# Altium footprint library pi4.PcbLib: 46 footprints (part 1 of 3)
Each footprint in its own frame and in the unit in brackets; x right, y up, seen from the top. Pads: shape width x height; smd on the part's side, far side on the other; paste and mask are expansions set on the pad; w line width, h text height; cw(c..) or ccw(c..) is an arc to the next point about the centre after c.
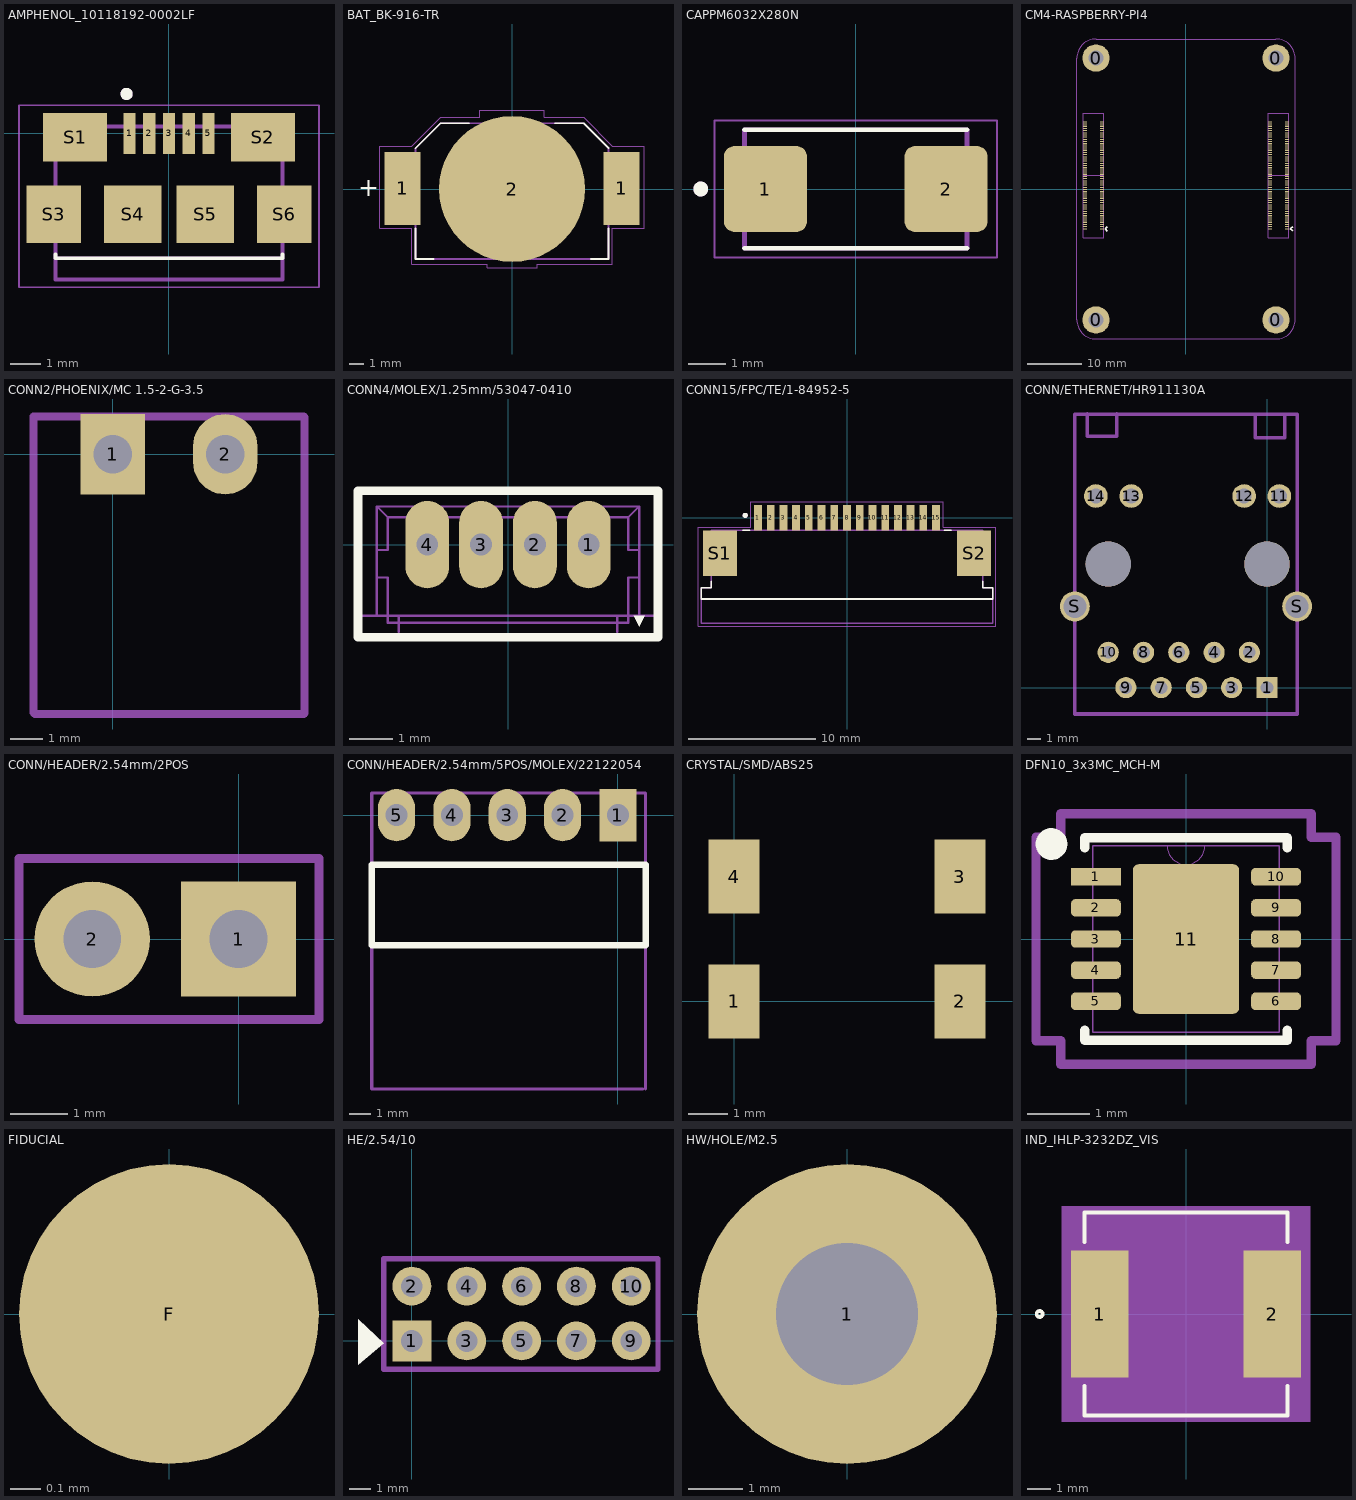
[diagram p0: the footprints below, top view; thin cyan lines are the x and y axes]

## AMPHENOL_10118192-0002LF [mm]
pads (11):
  rect 0.4x1.35 smd: 1(-1.3,0) 2(-0.65,0) 3(0,0) 4(0.65,0) 5(1.3,0)
  rect 2.1x1.6 smd: S1(-3.1,-0.125) S2(3.1,-0.125)
  rect 1.8x1.9 smd: S3(-3.8,-2.675) S6(3.8,-2.675)
  rect 1.9x1.9 smd: S4(-1.2,-2.675) S5(1.2,-2.675)
Top Overlay:
  circle w0.2: c-1.4,1.3 r0.1
  lines w0.127: -3.75,-4 -3.75,-4.125 3.75,-4.125 3.75,-4
Mechanical 13:
  circle w0.2: c-1.4,1.3 r0.1
  lines w0.127: -3.75,-4.125 3.75,-4.125 ; -3.75,-4.125 -3.75,0.225 3.75,0.225 3.75,-4.125 ; -3.75,-4.125 -3.75,-4.825 3.75,-4.825 3.75,-4.125
Mechanical 15:
  lines w0.05: -4.95,-5.075 -4.95,0.925 4.95,0.925 4.95,-5.075 -4.95,-5.075
3D body "10118192-002lfc.STEP": height 2.73, standoff -0.04, extent -3.956,-4.846 3.956,0.254

## BAT_BK-916-TR [mm]
pads (3):
  rect 2.5x5.1 smd: 1(-7.65,0.05) 1(7.65,0.05)
  round 10.2 smd mask+0.508: 2(0,0)
Top Overlay:
  lines w0.127: -6.75,-2.75 -6.75,-4.9 -5.5,-4.9 ; -6.75,2.85 -5,4.6 -3,4.6 ; 3,4.6 5,4.6 6.75,2.85 ; 5.5,-4.9 6.75,-4.9 6.75,-2.75
  text "+" at -10.767,-0.501 h1.27
Mechanical 13:
  lines w0.127: -6.75,-4.9 6.75,-4.9 6.75,2.85 5,4.6 -5,4.6 -6.75,2.85 -6.75,-4.9
Mechanical 15:
  lines w0.05: -9.25,-2.75 -7,-2.75 -7,-5.25 -1.75,-5.25 -1.75,-5.5 1.75,-5.5 1.75,-5.25 7,-5.25 7,-2.75 9.25,-2.75 9.25,3 7,3 5,5 2.25,5 2.25,5.5 -2.25,5.5 -2.25,5 -5,5 -7,3 -9.25,3 -9.25,-2.75
3D body "BK-916.STEP": height 3.7, standoff 0, extent -7.798,-4.952 7.802,4.648
3D body "User Library-CR1216.STEP": height 1.6, standoff 0, extent -6.276,-5.944 6.124,6.456

## CAPPM6032X280N [mm]
pads (2):
  rrect25% 2.24x2.32 smd: 1(-2.435,0) 2(2.435,0)
Top Overlay:
  circle w0.2: c-4.18,0 r0.1
  lines w0.127: -3,-1.6 3,-1.6 ; -3,1.6 3,1.6
Mechanical 13:
  circle w0.2: c-4.18,0 r0.1
  lines w0.127: -3,-1.6 3,-1.6 3,1.6 -3,1.6 -3,-1.6
Mechanical 15:
  lines w0.05: -3.81,-1.85 3.81,-1.85 3.81,1.85 -3.805,1.85 -3.81,-1.85
3D body "AVX_C_CASE.STEP": height 2.7, standoff 0, extent -3.05,-1.675 3.05,1.675

## CM4-RASPBERRY-PI4 [mm] "DF40C-100DS-0.4v by Amornthep Phunsin"
pads (204):
  round 5 hole 2.7: 0(-16.5,-24) 0(-16.5,24) 0(16.5,-24) 0(16.5,24)
  rect 0.7x0.2 smd: 1(18.5,-7.3) 2(15.42,-7.3) 3(18.5,-6.9) 4(15.42,-6.9) 5(18.5,-6.5) 6(15.42,-6.5) 7(18.5,-6.1) 8(15.42,-6.1) 9(18.5,-5.7) 10(15.42,-5.7) 11(18.5,-5.3) 12(15.42,-5.3) 13(18.5,-4.9) 14(15.42,-4.9) 15(18.5,-4.5) 16(15.42,-4.5) 17(18.5,-4.1) 18(15.42,-4.1) 19(18.5,-3.7) 20(15.42,-3.7) 21(18.5,-3.3) 22(15.42,-3.3) 23(18.5,-2.9) 24(15.42,-2.9) 25(18.5,-2.5) 26(15.42,-2.5) 27(18.5,-2.1) 28(15.42,-2.1) 29(18.5,-1.7) 30(15.42,-1.7) 31(18.5,-1.3) 32(15.42,-1.3) 33(18.5,-0.9) 34(15.42,-0.9) 35(18.5,-0.5) 36(15.42,-0.5) 37(18.5,-0.1) 38(15.42,-0.1) 39(18.5,0.3) 40(15.42,0.3) 41(18.5,0.7) 42(15.42,0.7) 43(18.5,1.1) 44(15.42,1.1) 45(18.5,1.5) 46(15.42,1.5) 47(18.5,1.9) 48(15.42,1.9) 49(18.5,2.3) 50(15.42,2.3) 51(18.5,2.7) 52(15.42,2.7) 53(18.5,3.1) 54(15.42,3.1) 55(18.5,3.5) 56(15.42,3.5) 57(18.5,3.9) 58(15.42,3.9) 59(18.5,4.3) 60(15.42,4.3) 61(18.5,4.7) 62(15.42,4.7) 63(18.5,5.1) 64(15.42,5.1) 65(18.5,5.5) 66(15.42,5.5) 67(18.5,5.9) 68(15.42,5.9) 69(18.5,6.3) 70(15.42,6.3) 71(18.5,6.7) 72(15.42,6.7) 73(18.5,7.1) 74(15.42,7.1) 75(18.5,7.5) 76(15.42,7.5) 77(18.5,7.9) 78(15.42,7.9) 79(18.5,8.3) 80(15.42,8.3) 81(18.5,8.7) 82(15.42,8.7) 83(18.5,9.1) 84(15.42,9.1) 85(18.5,9.5) 86(15.42,9.5) 87(18.5,9.9) 88(15.42,9.9) 89(18.5,10.3) 90(15.42,10.3) 91(18.5,10.7) 92(15.42,10.7) 93(18.5,11.1) 94(15.42,11.1) 95(18.5,11.5) 96(15.42,11.5) 97(18.5,11.9) 98(15.42,11.9) 99(18.5,12.3) 100(15.42,12.3) 101(-15.42,-7.3) 102(-18.5,-7.3) 103(-15.42,-6.9) 104(-18.5,-6.9) 105(-15.42,-6.5) 106(-18.5,-6.5) 107(-15.42,-6.1) 108(-18.5,-6.1) 109(-15.42,-5.7) 110(-18.5,-5.7) 111(-15.42,-5.3) 112(-18.5,-5.3) 113(-15.42,-4.9) 114(-18.5,-4.9) 115(-15.42,-4.5) 116(-18.5,-4.5) 117(-15.42,-4.1) 118(-18.5,-4.1) 119(-15.42,-3.7) 120(-18.5,-3.7) 121(-15.42,-3.3) 122(-18.5,-3.3) 123(-15.42,-2.9) 124(-18.5,-2.9) 125(-15.42,-2.5) 126(-18.5,-2.5) 127(-15.42,-2.1) 128(-18.5,-2.1) 129(-15.42,-1.7) 130(-18.5,-1.7) 131(-15.42,-1.3) 132(-18.5,-1.3) 133(-15.42,-0.9) 134(-18.5,-0.9) 135(-15.42,-0.5) 136(-18.5,-0.5) 137(-15.42,-0.1) 138(-18.5,-0.1) 139(-15.42,0.3) 140(-18.5,0.3) 141(-15.42,0.7) 142(-18.5,0.7) 143(-15.42,1.1) 144(-18.5,1.1) 145(-15.42,1.5) 146(-18.5,1.5) 147(-15.42,1.9) 148(-18.5,1.9) 149(-15.42,2.3) 150(-18.5,2.3) 151(-15.42,2.7) 152(-18.5,2.7) 153(-15.42,3.1) 154(-18.5,3.1) 155(-15.42,3.5) 156(-18.5,3.5) 157(-15.42,3.9) 158(-18.5,3.9) 159(-15.42,4.3) 160(-18.5,4.3) 161(-15.42,4.7) 162(-18.5,4.7) 163(-15.42,5.1) 164(-18.5,5.1) 165(-15.42,5.5) 166(-18.5,5.5) 167(-15.42,5.9) 168(-18.5,5.9) 169(-15.42,6.3) 170(-18.5,6.3) 171(-15.42,6.7) 172(-18.5,6.7) 173(-15.42,7.1) 174(-18.5,7.1) 175(-15.42,7.5) 176(-18.5,7.5) 177(-15.42,7.9) 178(-18.5,7.9) 179(-15.42,8.3) 180(-18.5,8.3) 181(-15.42,8.7) 182(-18.5,8.7) 183(-15.42,9.1) 184(-18.5,9.1) 185(-15.42,9.5) 186(-18.5,9.5) 187(-15.42,9.9) 188(-18.5,9.9) 189(-15.42,10.3) 190(-18.5,10.3) 191(-15.42,10.7) 192(-18.5,10.7) 193(-15.42,11.1) 194(-18.5,11.1) 195(-15.42,11.5) 196(-18.5,11.5) 197(-15.42,11.9) 198(-18.5,11.9) 199(-15.42,12.3) 200(-18.5,12.3)
Top Overlay:
  lines w0.254: -14.415,-7.704 -14.815,-7.304 ; -14.415,-6.904 -14.815,-7.304 ; 19.538,-7.688 19.138,-7.288 ; 19.538,-6.888 19.138,-7.288 ; -14.815,-7.304 -14.815,-7.304 ; 19.138,-7.288 19.138,-7.288
Mechanical 4:
  lines w0.12: -18.83,2.5 -15.05,2.5 ; 15.07,2.5 18.85,2.5 ; -18.85,-8.9 -15.07,-8.9 -15.07,13.9 -18.85,13.9 -18.85,-8.9 ; 15.07,-8.9 15.07,13.9 18.85,13.9 18.85,-8.9 15.07,-8.9
  text "PCIe" at -18,-3.051 h0.7
  text "USB" at -16.9,-4.134 h0.7
  text "CAM1" at -16.9,0.749 h0.7
  text "HDMI1" at -18.1,5.958 h0.7
  text "ETH" at 16.5,-4.751 h0.7
  text "TV" at -17,-2.751 h0.7
  text "HDMI0" at -18,10.375 h0.7
  text "CAM0" at -18,0.783 h0.7
  text "5V" at 17,9.9 h0.7
  text "DSI0" at -16.9,6.949 h0.7
  text "DS1" at -17.5,13.049 h0.7
  text "1V8" at 15.8,11.225 h0.7
  text "3V3" at 15.8,8.625 h0.7
  text "SD" at 16.4,6.991 h0.7
  text "GPIO" at 16.5,0.625 h0.7
Mechanical 15:
  lines w0.12: -20,-24 ccw(c-16.5,-24) -16.5,-27.5 16.5,-27.5 ccw(c16.5,-24) 20,-24 20,24 ccw(c16.5,24) 16.5,27.5 -16.5,27.5 ccw(c-16.5,24) -20,24 -20,-24
3D body "DF40C-100DS.stp": height 1.4, standoff -0.05, extent 15.31,-8.785 18.69,13.815
3D body "DF40C-100DS.stp": height 1.4, standoff -0.05, extent -18.69,-8.785 -15.31,13.815
3D body "cm4-rev1-3_new.STEP": height 5.15, standoff 0.37, extent -20,-27.5 20,27.5

## CONN2/PHOENIX/MC 1.5-2-G-3.5 [mm]
pads (2):
  rect 2x2.5 hole 1.2: 1(0,0)
  oval 2x2.5 hole 1.2: 2(3.5,0)
Mechanical 11:
  lines w0.254: -2.464,-8.026 -2.413,-8.077 ; 5.944,-8.077 5.969,-8.052 ; 5.944,1.168 5.969,1.143
Mechanical 15:
  lines w0.254: -2.464,-8.026 -2.464,1.168 ; -2.413,-8.077 5.944,-8.077 ; -2.413,1.168 5.944,1.168 ; 5.969,-8.052 5.969,1.143
3D body "pxc_1844210_05_MC-1-5-2-G-3-5_3D.stp": height 7.25, standoff -3.4, extent -2.413,-8.029 5.987,1.171

## CONN4/MOLEX/1.25mm/53047-0410 [mil]
pads (4):
  oval 40x80 hole 20: 1(73.82,0) 2(24.61,0) 3(-24.61,0) 4(-73.82,0)
Top Overlay:
  region: 120,-75 115,-65 125,-65
  lines w8: -137.2,-84.65 137.2,-84.65 137.2,49.21 -137.2,49.21 -137.2,-84.65
Mechanical 13:
  region: -63.82,-20 -83.82,-20 -83.82,20 -63.82,20
  region: -14.61,-20 -34.61,-20 -34.61,20 -14.61,20
  region: 34.61,-20 14.61,-20 14.61,20 34.61,20
  region: 83.82,-20 63.82,-20 63.82,20 83.82,20
  lines w2: -133.94,-65 -120,-65 ; -100,-80 -100,-65 ; 100,-80 100,-65 ; 133.94,-65 120,-65 ; -120,-65 -110,-65 ; -120,-65 -120,-30 ; -120,-30 -120,-5 ; -120,-30 -110,-30 -110,-65 ; -120,-5 -120,35 ; -120,-5 -110,-5 -110,25 ; -120,35 120,35 ; -120,35 -110,25 ; -110,-65 -100,-65 ; -110,-65 -110,-71.5 110,-71.5 110,-65 ; -110,25 110,25 ; -100,-65 100,-65 ; 100,-65 110,-65 ; 110,-65 120,-65 ; 110,-65 110,-30 120,-30 ; 110,25 110,-5 120,-5 ; 110,25 120,35 ; 120,-65 120,-30 ; 120,-30 120,-5 ; 120,-5 120,35
3D body "530470410.STEP": height 166.39, standoff -89.52, extent -132.87,-80 132.87,45.98

## CONN15/FPC/TE/1-84952-5 [mm]
pads (17):
  rect 0.61x2 smd: 1(-7,0) 2(-6,0) 3(-5,0) 4(-4,0) 5(-3,0) 6(-2,0) 7(-1,0) 8(0,0) 9(1,0) 10(2,0) 11(3,0) 12(4,0) 13(5,0) 14(6,0) 15(7,0)
  rect 2.68x3.6 smd: S1(-9.99,-2.8) S2(9.99,-2.8)
Top Overlay:
  circle w0.2: c-8,0.17 r0.1
  lines w0.127: -10.675,-5 -10.675,-5.51 -11.46,-5.51 -11.46,-6.4 11.46,-6.4 11.46,-5.51 10.675,-5.51 10.675,-5 ; -8.2,-1 -7.64,-1 ; 7.64,-1 8.2,-1
Mechanical 13:
  circle w0.2: c-8,0.17 r0.1
  lines w0.127: -11.46,-6.4 -11.46,-8.3 11.46,-8.3 11.46,-6.4 ; -11.46,-6.4 11.46,-6.4 ; -11.46,-6.4 -11.46,-5.51 -10.675,-5.51 -10.675,-1 10.675,-1 10.675,-5.51 11.46,-5.51 11.46,-6.4
Mechanical 15:
  lines w0.05: -11.71,-8.55 11.71,-8.55 11.71,-0.75 7.555,-0.75 7.555,1.25 -7.555,1.25 -7.555,-0.75 -11.71,-0.75 -11.71,-8.55
3D body "1-84952-5.STEP": height 2.54, standoff -0.02, extent -11.46,-6.491 11.46,0.049

## CONN/ETHERNET/HR911130A [mil]
pads (18):
  rect 60x60 hole 35.83: 1(0,0)
  round 60 hole 35.83: 2(-50,100) 3(-100,0) 4(-150,100) 5(-200,0) 6(-250,100) 7(-300,0) 8(-350,100) 9(-400,0) 10(-450,100)
  round 66.93 hole 43.31: 11(35,543) 12(-65,543) 13(-385,543) 14(-485,543)
  round 85 hole 65: S(-544.63,230.14) S(85.37,230.14)
  round 127.95 hole 127.95 unplated: ""(-450,350) ""(0,350)
Mechanical 15:
  lines w10: -509.16,775.44 -509.16,712.44 -426.48,712.44 -426.48,743.94 -426.48,775.44 ; -32.81,771.5 -32.81,708.5 49.87,708.5 49.87,740 49.87,771.5 ; -544.63,-74.76 -544.63,775.24 85.37,775.24 85.37,-74.76 -544.63,-74.76
3D body "User Library-HR911130A.STEP": height 531.5, standoff -118.11, extent -537.2,-62.26 88,780.26

## CONN/HEADER/2.54mm/2POS [mm]
pads (2):
  rect 2x2 hole 1: 1(0,0)
  round 2 hole 1: 2(-2.54,0)
Mechanical 15:
  lines w0.15: -3.81,-1.397 1.397,-1.397 1.397,1.397 -3.81,1.397 -3.81,-1.397
3D body "99887.STEP": height 8.38, standoff -2.54, extent -3.937,-1.27 1.27,1.27

## CONN/HEADER/2.54mm/5POS/MOLEX/22122054 [mm]
pads (5):
  rect 1.7x2.4 hole 1: 1(0,0)
  oval 1.7x2.4 hole 1: 2(-2.54,0) 3(-5.08,0) 4(-7.62,0) 5(-10.16,0)
Top Overlay:
  lines w0.3: -11.303,-5.969 1.27,-5.969 1.27,-2.286 -11.303,-2.286 -11.303,-5.969
Mechanical 15:
  lines w0.15: -9.422,-12.573 -10.676,-12.573 -11.303,-12.573 -11.303,1.016 1.27,1.016 1.27,-12.573 ; -9.398,-12.573 1.143,-12.573
3D body "22122054.STEP": height 6.43, standoff -3.51, extent -11.354,-12.611 1.194,0.318

## CRYSTAL/SMD/ABS25 [mm]
pads (4):
  rect 1.3x1.9 smd: 1(0,0) 2(5.8,0) 3(5.8,3.2) 4(0,3.2)
3D body "ZM206.STEP": height 2.43, standoff -0.1, extent -1.141,-0.362 6.859,3.438

## DFN10_3x3MC_MCH-M [mm]
pads (11):
  rect 0.8x0.28 smd paste+0 mask+0: 1(-1.445,1)
  rrect50% 0.8x0.28 smd paste+0 mask+0: 2(-1.445,0.5) 3(-1.445,0) 4(-1.445,-0.5) 5(-1.445,-1) 6(1.445,-1) 7(1.445,-0.5) 8(1.445,0) 9(1.445,0.5) 10(1.445,1)
  rrect10% 1.7x2.4 smd paste+0 mask+0: 11(0,0)
Top Overlay:
  circle w0.254: c-2.159,1.524 r0.127
  lines w0.152: -1.626,-1.46 -1.626,-1.626 1.626,-1.626 1.626,-1.46 ; -1.626,1.46 -1.626,1.626 1.626,1.626 1.626,1.46
Mechanical 13:
  lines w0: -0.305,1.499 ccw(c0,1.499) 0.305,1.499
  lines w0.025: -1.499,-1.499 -1.499,1.499 1.499,1.499 1.499,-1.499 -1.499,-1.499
Mechanical 15:
  lines w0.152: -2.407,-1.635 -2.007,-1.635 -2.007,-2.007 2.007,-2.007 2.007,-1.635 2.407,-1.635 2.407,1.635 2.007,1.635 2.007,2.007 -2.007,2.007 -2.007,1.635 -2.407,1.635 -2.407,-1.635
3D body "DFN10_3x3MC_MCH.step": height -0.42, standoff -1.36, extent -1.499,-1.499 1.499,1.499

## FIDUCIAL [mm] "Fiducial marker"
pads (1):
  round 1 smd paste+0 mask+0.5: F(0,0)

## HE/2.54/10 [mm]
pads (10):
  rect 1.8x1.9 hole 1: 1(0,0)
  round 1.8 hole 1: 2(0,2.54) 3(2.54,0) 4(2.54,2.54) 5(5.08,0) 6(5.08,2.54) 7(7.62,0) 8(7.62,2.54) 9(10.16,0) 10(10.16,2.54)
Top Overlay:
  region: -1.3,-0.1 -2.5,-1.1 -2.5,1
Mechanical 15:
  lines w0.254: -1.3,-1.3 11.4,-1.3 11.4,3.8 -1.3,3.8 -1.3,-1.3
Mechanical 16:
  lines w0.254: -1.3,-1.3 11.4,-1.3 11.4,3.8 -1.3,3.8 -1.3,-1.3
3D body "PR20205VBDN.STEP": height 8.3, standoff -2.62, extent -1.27,-1.27 11.43,3.81

## HW/HOLE/M2.5 [mm]
pads (1):
  round 5.5 / inner round 4 / far side round 4 hole 2.6: 1(0,0)

## IND_IHLP-3232DZ_VIS [mil]
pads (2):
  rect 95x210 smd paste-47.5 mask+0: 1(-142.5,0) 2(142.5,0)
Top Overlay:
  circle w6: c-241.5,0 r5
  lines w6: -167.5,-118.1 -167.5,-167.5 167.5,-167.5 167.5,-118.1 ; -167.5,118.1 -167.5,167.5 167.5,167.5 167.5,118.1
Mechanical 5:
  region: 205,-177.5 -205,-177.5 -205,177.5 205,177.5
Mechanical 13:
  circle w0: c-95,0 r3
  lines w0: -12,162.5 ccw(c0,162.5) 12,162.5
  lines w1: -162.5,-162.5 -162.5,162.5 162.5,162.5 162.5,-162.5 -162.5,-162.5
Mechanical 15:
  region: -172.5,-115 -200,-115 -200,115 -172.5,115 -172.5,172.5 172.5,172.5 172.5,115 200,115 200,-115 172.5,-115 172.5,-172.5 -172.5,-172.5
  lines w6: -200,-115 -172.5,-115 -172.5,-172.5 172.5,-172.5 172.5,-115 200,-115 200,115 172.5,115 172.5,172.5 -172.5,172.5 -172.5,115 -200,115 -200,-115
3D body "IND_IHLP-3232DZ_VIS.STEP": height 158.11, standoff 0, extent -162.47,-162.47 162.49,162.49
3D body: height 10, standoff 0, extent 0,0 10,10